# Altium footprint library Mylib.PcbLib: 294 footprints (part 8 of 19)
Each footprint in its own frame and in the unit in brackets; x right, y up, seen from the top. Pads: shape width x height; smd on the part's side, far side on the other; paste and mask are expansions set on the pad; w line width, h text height; cw(c..) or ccw(c..) is an arc to the next point about the centre after c.
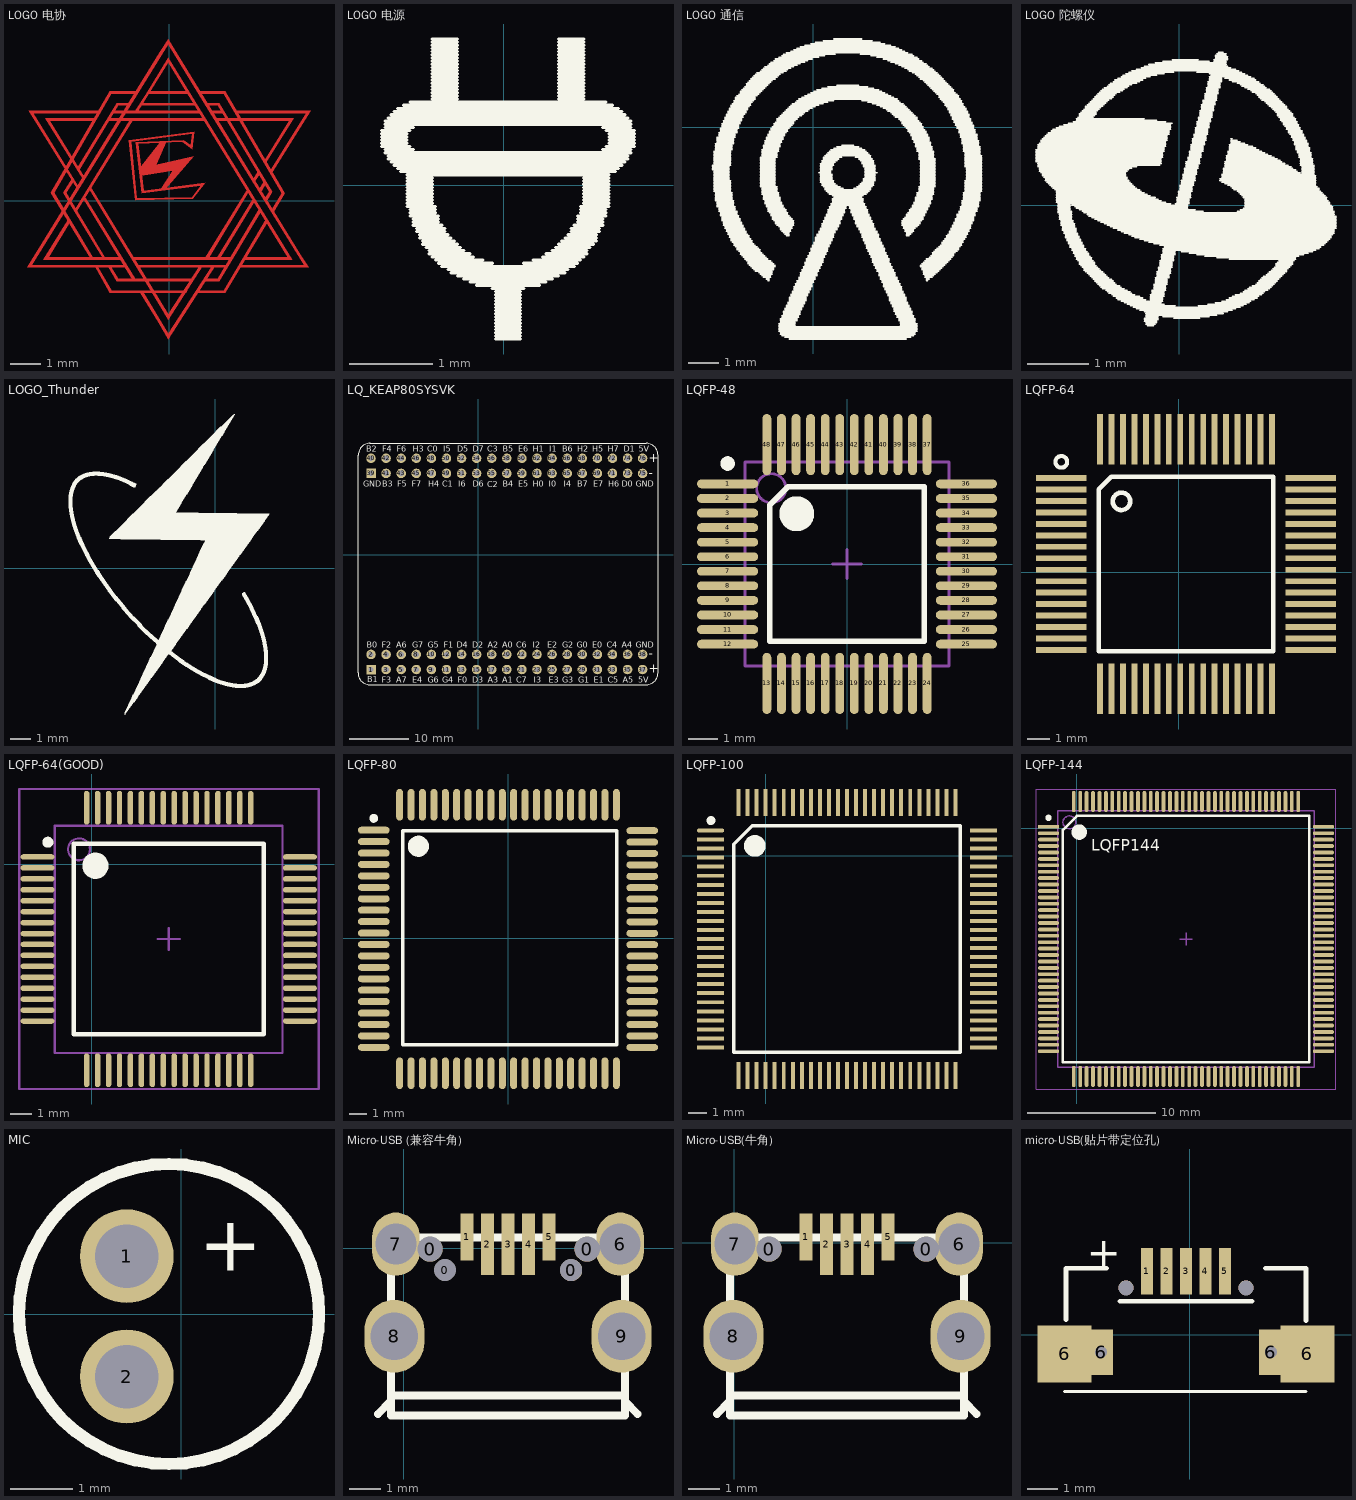
[diagram p7: the footprints below, top view; thin cyan lines are the x and y axes]

## LOGO 电协 [mm]
Top Layer:
  region: -0.307,1.911 -0.961,1.079 -0.917,0.832 0.124,0.984 -0.282,0.374 -0.13,0.374 0.81,1.467 -0.422,1.187 -0.092,1.949
  region: -0.028,5.327 -0.307,4.896 -4.676,-2.191 -4.473,-2.191 -1.45,-2.192 -1.4,-2.115 -1.568,-1.834 -1.654,-1.861 -3.965,-1.861 -3.279,-0.743 -3.33,-0.642 -4.143,-1.937 -1.603,-1.937 -1.488,-2.115 -4.524,-2.115 -0.028,5.15 1.344,2.914 4.442,-2.115 2.41,-2.115 2.36,-2.191 4.595,-2.191 4.341,-1.785
  region: -1.12,2.965 -0.765,3.499 -0.028,4.718 4.061,-1.937 2.512,-1.937 2.563,-1.861 3.909,-1.861 -0.028,4.565 -1.019,2.965
  region: 1.242,3.219 1.648,3.219 3.401,0.298 3.223,-0.007 3.172,0.095 3.299,0.298 1.598,3.143 1.293,3.143
  region: -1.171,-1.861 0.607,-1.861 2.029,-1.861 2.004,-1.937 -1.171,-1.937
  region: -1.019,-2.115 0.759,-2.115 1.928,-2.115 1.902,-2.191 -1.019,-2.191
  region: -1.679,-2.572 -0.612,-2.572 0.81,-2.572 0.785,-2.648 -1.73,-2.648 -2.009,-2.166 -1.908,-2.191
  region: 1.013,3.6 1.852,3.6 3.807,0.247 3.426,-0.388 3.376,-0.286 3.706,0.247 1.801,3.524 1.013,3.524
  region: -1.095,3.6 -1.957,3.6 -3.889,0.273 -2.58,-1.909 -2.517,-1.861 -3.787,0.273 -1.908,3.524 -1.095,3.524
  region: -2.314,2.965 -4.625,2.965 -3.025,0.4 -2.974,0.451 -4.473,2.889 -2.365,2.889
  region: -2.428,2.711 -4.079,2.711 -2.847,0.73 -2.771,0.755 -3.927,2.635 -2.517,2.635
  region: -1.298,2.66 -3.089,-0.273 -3.038,-0.349 -1.196,2.66
  region: 2.588,0.4 1.191,-1.873 1.217,-1.912 1.318,-1.861 2.639,0.324
  region: 2.791,0.095 1.572,-1.886 1.674,-1.912 2.842,0.019
  region: 2.966,-0.266 1.598,-2.572 1.217,-2.572 1.191,-2.648 1.648,-2.648 3.045,-0.311
  region: 3.198,-0.591 1.801,-2.953 0.963,-2.953 0.912,-3.029 1.852,-3.029 3.249,-0.692
  region: -3.178,0.654 -3.193,0.746 -3.482,0.273 -2.173,-1.909 -2.111,-1.861 -3.381,0.273 -3.119,0.671
  region: -1.895,-2.953 -0.828,-2.953 0.594,-2.953 0.569,-3.029 -1.946,-3.029 -2.454,-2.14 -2.352,-2.166
  region: -0.942,-3.029 -0.333,-4.02 -0.021,-4.549 1.521,-2.14 1.42,-2.14 -0.021,-4.375 -0.866,-2.978 -0.942,-3.004
  region: -2.613,0.364 -0.333,-3.385 -0.021,-3.914 1.115,-2.14 1.013,-2.14 -0.021,-3.74 -0.866,-2.343 -2.593,0.476
  region: -2.816,0.06 -1.192,-2.61 -1.108,-2.61 -1.117,-2.57 -2.797,0.171
  region: 0.836,2.279 0.759,1.695 0.429,1.949 0.48,2 0.709,1.822 0.759,2.203 -1.247,1.949 -1.057,0.082 0.759,0.12 1.039,0.501 -0.892,0.247 -1.095,1.924 0.48,2 0.455,1.975 0.429,1.949 -1.019,1.873 -0.841,0.324 1.064,0.578 1.191,0.603 0.785,0.07 -1.12,0.019 -1.323,2
  region: -1.781,2.965 0.988,2.965 0.988,2.94 1.013,2.889 -1.831,2.889
  region: -2.009,2.635 -1.958,2.711 1.115,2.711 1.166,2.635
  region: -0.942,3.219 0.836,3.219 0.81,3.219 0.861,3.194 0.861,3.143 -0.993,3.143
  region: -1.323,3.219 -1.73,3.219 -3.013,1.098 -2.949,1.035 -1.679,3.143 -1.374,3.143
  region: 1.75,2.965 1.394,2.965 1.344,2.914 1.445,2.914 1.471,2.889 1.75,2.889
  region: 1.928,2.711 1.572,2.711 1.521,2.66 1.598,2.635 1.623,2.635 1.648,2.635 1.928,2.635
  region: -0.663,3.6 0.607,3.6 0.632,3.575 0.658,3.549 0.683,3.524 -0.714,3.524
  region: 2.207,2.965 4.646,2.965 4.671,2.965 3.401,0.933 3.337,0.997 4.519,2.889 2.233,2.889
  region: 1.648,2.711 4.087,2.711 4.112,2.711 3.172,1.213 3.147,1.34 3.96,2.635 1.674,2.635
  region: 2.766,0.705 2.918,0.959 2.969,0.908 2.969,0.857 2.842,0.654 2.791,0.654
  region: 2.969,0.374 3.122,0.628 3.172,0.578 3.172,0.527 3.045,0.324 2.995,0.324
  text "协" at 0.201,-1.683 h0.76
  text "电" at -0.739,-1.683 h0.76
  text "大" at 1.115,-0.794 h0.76
  text "集" at -1.552,-0.794 h0.76
Top Solder:
  drawing of 33 lines, arcs and shapes, not listed
  text "集" at -1.552,-0.794 h0.76
  text "大" at 1.115,-0.794 h0.76
  text "电" at -0.739,-1.683 h0.76
  text "协" at 0.201,-1.683 h0.76

## LOGO 电源 [mm]
Top Overlay:
  drawing of 152 lines, arcs and shapes, not listed

## LOGO 通信 [mm]
Top Overlay:
  drawing of 720 lines, arcs and shapes, not listed

## LOGO 陀螺仪 [mm]
Top Overlay:
  drawing of 476 lines, arcs and shapes, not listed

## LOGO_Thunder [mm]
Top Overlay:
  drawing of 2284 lines, arcs and shapes, not listed

## LQ_KEAP80SYSVK [mm]
pads (76):
  rect 1.6x1.6 hole 0.9: 1(-18.016,-19.342) 39(-18.016,13.678)
  round 1.6 hole 0.9: 2(-18.016,-16.802) 3(-15.476,-19.342) 4(-15.476,-16.802) 5(-12.936,-19.342) 6(-12.936,-16.802) 7(-10.396,-19.342) 8(-10.396,-16.802) 9(-7.856,-19.342) 10(-7.856,-16.802) 11(-5.316,-19.342) 12(-5.316,-16.802) 13(-2.776,-19.342) 14(-2.776,-16.802) 15(-0.236,-19.342) 16(-0.236,-16.802) 17(2.304,-19.342) 18(2.304,-16.802) 19(4.844,-19.342) 20(4.844,-16.802) 21(7.384,-19.342) 22(7.384,-16.802) 23(9.924,-19.342) 24(9.924,-16.802) 25(12.464,-19.342) 26(12.464,-16.802) 27(15.004,-19.342) 28(15.004,-16.802) 29(17.544,-19.342) 30(17.544,-16.802) 31(20.084,-19.342) 32(20.084,-16.802) 33(22.624,-19.342) 34(22.624,-16.802) 35(25.164,-19.342) 36(25.164,-16.802) 37(27.704,-19.342) 38(27.704,-16.802) 40(-18.016,16.218) 41(-15.476,13.678) 42(-15.476,16.218) 43(-12.936,13.678) 44(-12.936,16.218) 45(-10.396,13.678) 46(-10.396,16.218) 47(-7.856,13.678) 48(-7.856,16.218) 49(-5.316,13.678) 50(-5.316,16.218) 51(-2.776,13.678) 52(-2.776,16.218) 53(-0.236,13.678) 54(-0.236,16.218) 55(2.304,13.678) 56(2.304,16.218) 57(4.844,13.678) 58(4.844,16.218) 59(7.384,13.678) 60(7.384,16.218) 61(9.924,13.678) 62(9.924,16.218) 63(12.464,13.678) 64(12.464,16.218) 65(15.004,13.678) 66(15.004,16.218) 67(17.544,13.678) 68(17.544,16.218) 69(20.084,13.678) 70(20.084,16.218) 71(22.624,13.678) 72(22.624,16.218) 73(25.164,13.678) 74(25.164,16.218) 75(27.704,13.678) 76(27.704,16.218)
Top Overlay:
  lines w0.2: -20.208,16.739 -20.208,-19.905 ccw(c-18.208,-19.905) -18.208,-21.905 28.292,-21.905 ccw(c28.292,-19.905) 30.292,-19.905 30.292,16.739 ccw(c28.292,16.739) 28.292,18.739 -18.208,18.739 ; -20.158,16.749 cw(c-18.158,16.749) -18.158,18.749
  text "-" at 28.752,13.039 h1.5
  text "+" at 28.742,-19.901 h1.5
  text "-" at 28.752,-17.401 h1.5
  text "+" at 28.762,15.579 h1.5
  text "C3" at 1.522,17.289 h1
  text "H2" at 16.702,17.289 h1
  text "5V" at 26.992,-21.561 h1
  text "A5" at 24.322,-21.561 h1
  text "C5" at 21.822,-21.561 h1
  text "E1" at 19.482,-21.551 h1
  text "G1" at 16.902,-21.561 h1
  text "G3" at 14.132,-21.561 h1
  text "E3" at 11.882,-21.551 h1
  text "I3" at 9.352,-21.561 h1
  text "C7" at 6.472,-21.561 h1
  text "A1" at 4.082,-21.561 h1
  text "A3" at 1.602,-21.561 h1
  text "D3" at -0.938,-21.561 h1
  text "F0" at -3.428,-21.561 h1
  text "G4" at -6.068,-21.561 h1
  text "G6" at -8.488,-21.561 h1
  text "E4" at -11.048,-21.561 h1
  text "A7" at -13.768,-21.561 h1
  text "F3" at -16.208,-21.561 h1
  text "GND" at 26.532,-15.641 h1
  text "A4" at 24.212,-15.641 h1
  text "C4" at 21.652,-15.641 h1
  text "E0" at 19.192,-15.641 h1
  text "G0" at 16.642,-15.641 h1
  text "G2" at 14.132,-15.641 h1
  text "E2" at 11.642,-15.641 h1
  text "I2" at 9.212,-15.641 h1
  text "C6" at 6.472,-15.641 h1
  text "A0" at 4.082,-15.641 h1
  text "A2" at 1.602,-15.641 h1
  text "D2" at -0.938,-15.641 h1
  text "D4" at -3.548,-15.641 h1
  text "F1" at -5.798,-15.641 h1
  text "G5" at -8.488,-15.641 h1
  text "G7" at -11.048,-15.641 h1
  text "A6" at -13.768,-15.641 h1
  text "F2" at -16.208,-15.641 h1
  text "B0" at -18.758,-15.641 h1
  text "GND" at 26.512,11.399 h1
  text "D0" at 24.192,11.399 h1
  text "H6" at 21.952,11.399 h1
  text "E7" at 19.392,11.389 h1
  text "B7" at 16.722,11.399 h1
  text "I4" at 14.442,11.389 h1
  text "I0" at 11.872,11.389 h1
  text "H0" at 9.222,11.399 h1
  text "E5" at 6.772,11.389 h1
  text "B4" at 4.162,11.399 h1
  text "C2" at 1.552,11.379 h1
  text "D6" at -0.858,11.399 h1
  text "I6" at -3.308,11.429 h1
  text "C1" at -5.988,11.399 h1
  text "H4" at -8.408,11.399 h1
  text "F7" at -11.138,11.389 h1
  text "F5" at -13.568,11.389 h1
  text "B3" at -16.128,11.399 h1
  text "GND" at -19.328,11.429 h1
  text "5V" at 27.052,17.289 h1
  text "D1" at 24.532,17.289 h1
  text "H7" at 21.872,17.289 h1
  text "H5" at 19.252,17.289 h1
  text "B6" at 14.192,17.289 h1
  text "I1" at 11.962,17.289 h1
  text "H1" at 9.232,17.289 h1
  text "E6" at 6.772,17.289 h1
  text "B5" at 4.142,17.289 h1
  text "D7" at -0.878,17.289 h1
  text "D5" at -3.488,17.289 h1
  text "I5" at -5.878,17.319 h1
  text "C0" at -8.568,17.289 h1
  text "H3" at -10.988,17.289 h1
  text "F6" at -13.708,17.289 h1
  text "F4" at -16.148,17.289 h1
  text "B2" at -18.788,17.289 h1
  text "B1" at -18.618,-21.521 h1

## LQFP-48 [mm]
pads (48):
  oval 2.1x0.3 smd: 1(-4.1,2.75) 2(-4.1,2.25) 3(-4.1,1.75) 4(-4.1,1.25) 5(-4.1,0.75) 6(-4.1,0.25) 7(-4.1,-0.25) 8(-4.1,-0.75) 9(-4.1,-1.25) 10(-4.1,-1.75) 11(-4.1,-2.25) 12(-4.1,-2.75) 25(4.1,-2.75) 26(4.1,-2.25) 27(4.1,-1.75) 28(4.1,-1.25) 29(4.1,-0.75) 30(4.1,-0.25) 31(4.1,0.25) 32(4.1,0.75) 33(4.1,1.25) 34(4.1,1.75) 35(4.1,2.25) 36(4.1,2.75)
  oval 0.3x2.1 smd: 13(-2.75,-4.1) 14(-2.25,-4.1) 15(-1.75,-4.1) 16(-1.25,-4.1) 17(-0.75,-4.1) 18(-0.25,-4.1) 19(0.25,-4.1) 20(0.75,-4.1) 21(1.25,-4.1) 22(1.75,-4.1) 23(2.25,-4.1) 24(2.75,-4.1) 37(2.75,4.1) 38(2.25,4.1) 39(1.75,4.1) 40(1.25,4.1) 41(0.75,4.1) 42(0.25,4.1) 43(-0.25,4.1) 44(-0.75,4.1) 45(-1.25,4.1) 46(-1.75,4.1) 47(-2.25,4.1) 48(-2.75,4.1)
Top Overlay:
  circle w0.6: c-1.725,1.725 r0.3
  circle w0.25: c-4.1,3.45 r0.125
  lines w0.2: -2.65,-2.65 -2.65,2.025 -2.025,2.65 2.65,2.65 2.65,-2.65 -2.65,-2.65
Mechanical 13:
  circle w0.1: c-2.6,2.6 r0.5
  lines w0.1: -3.5,-3.5 3.5,-3.5 3.5,3.5 -3.5,3.5 -3.5,-3.5
Mechanical 15:
  lines w0.1: -0.5,0 0.5,0 ; 0,-0.5 0,0.5
3D body: height 1.5, standoff 0, extent -4.5,-4.5 4.5,4.5

## LQFP-64 [mil]
pads (64):
  rect 86.61x10 smd: 1(-202,162) 2(-202,142.31) 3(-202,122.63) 4(-202,102.94) 5(-202,83.26) 6(-202,63.58) 7(-202,43.89) 8(-202,24.21) 9(-202,4.52) 10(-202,-15.17) 11(-202,-34.85) 12(-202,-54.54) 13(-202,-74.22) 14(-202,-93.91) 15(-202,-113.59) 16(-202,-133.27) 33(227.13,-133.27) 34(227.13,-113.59) 35(227.13,-93.9) 36(227.13,-74.22) 37(227.13,-54.54) 38(227.13,-34.85) 39(227.13,-15.17) 40(227.13,4.52) 41(227.13,24.21) 42(227.13,43.89) 43(227.13,63.58) 44(227.13,83.26) 45(227.13,102.95) 46(227.13,122.63) 47(227.13,142.31) 48(227.13,162)
  rect 10x86.61 smd: 17(-135.07,-200.2) 18(-115.39,-200.2) 19(-95.7,-200.21) 20(-76.02,-200.2) 21(-56.33,-200.2) 22(-36.65,-200.2) 23(-16.96,-200.21) 24(2.72,-200.2) 25(22.41,-200.2) 26(42.09,-200.21) 27(61.78,-200.2) 28(81.46,-200.2) 29(101.15,-200.21) 30(120.83,-200.2) 31(140.52,-200.2) 32(160.21,-200.2) 49(160.2,228.93) 50(140.52,228.93) 51(120.83,228.93) 52(101.15,228.93) 53(81.46,228.93) 54(61.78,228.93) 55(42.09,228.93) 56(22.41,228.93) 57(2.72,228.93) 58(-16.96,228.93) 59(-36.65,228.93) 60(-56.33,228.93) 61(-76.02,228.93) 62(-95.7,228.93) 63(-115.39,228.93) 64(-135.07,228.93)
Top Overlay:
  circle w7: c-201.77,189.96 r10
  circle w7.87: c-98.43,122.05 r15
  lines w7.87: -137.63,-135.83 -137.63,142.88 -115.95,164.56 162.76,164.56 162.76,-135.83 -137.63,-135.83
3D body: height 63.78, standoff -0.28, extent -226.24,-225.4 251.84,252.68

## LQFP-64(GOOD) [mm]
pads (64):
  oval 1.55x0.25 smd: 1(-2.486,0.325) 2(-2.486,-0.175) 3(-2.486,-0.676) 4(-2.486,-1.175) 5(-2.486,-1.675) 6(-2.486,-2.175) 7(-2.486,-2.675) 8(-2.486,-3.176) 9(-2.486,-3.675) 10(-2.486,-4.175) 11(-2.486,-4.675) 12(-2.486,-5.175) 13(-2.486,-5.676) 14(-2.486,-6.175) 15(-2.486,-6.675) 16(-2.486,-7.175) 33(9.514,-7.175) 34(9.514,-6.675) 35(9.514,-6.175) 36(9.514,-5.676) 37(9.514,-5.175) 38(9.514,-4.675) 39(9.514,-4.175) 40(9.514,-3.675) 41(9.514,-3.176) 42(9.514,-2.675) 43(9.514,-2.175) 44(9.514,-1.675) 45(9.514,-1.175) 46(9.514,-0.676) 47(9.514,-0.175) 48(9.514,0.325)
  oval 0.25x1.55 smd: 17(-0.236,-9.426) 18(0.263,-9.426) 19(0.764,-9.426) 20(1.264,-9.426) 21(1.763,-9.426) 22(2.264,-9.426) 23(2.763,-9.426) 24(3.264,-9.426) 25(3.764,-9.426) 26(4.263,-9.426) 27(4.764,-9.426) 28(5.263,-9.426) 29(5.764,-9.426) 30(6.264,-9.426) 31(6.763,-9.426) 32(7.264,-9.426) 49(7.264,2.575) 50(6.763,2.575) 51(6.264,2.575) 52(5.764,2.575) 53(5.263,2.575) 54(4.764,2.575) 55(4.263,2.575) 56(3.764,2.575) 57(3.264,2.575) 58(2.763,2.575) 59(2.264,2.575) 60(1.763,2.575) 61(1.264,2.575) 62(0.764,2.575) 63(0.263,2.575) 64(-0.236,2.575)
Top Overlay:
  circle w0.25: c-2.011,1 r0.125
  circle w0.6: c0.163,-0.075 r0.3
  lines w0.2: -0.837,-7.775 -0.837,0.925 7.863,0.925 7.863,-7.775 -0.837,-7.775
Mechanical 13:
  circle w0.1: c-0.586,0.674 r0.5
  lines w0.1: -1.693,-8.632 -1.693,1.756 8.721,1.756 8.721,-8.632 -1.693,-8.632
Mechanical 15:
  lines w0.1: 3.013,-3.425 4.013,-3.425 ; 3.514,-3.925 3.514,-2.925 ; -3.319,-10.283 -3.319,3.433 10.372,3.433 10.372,-10.283 -3.319,-10.283
3D body: height 1.2, standoff 0, extent -1.693,-8.632 8.721,1.782
3D body: height 0.3, standoff 0, extent 7.137,2.003 7.391,3.146
3D body: height 0.3, standoff 0, extent 6.646,2.003 6.9,3.146
3D body: height 0.3, standoff 0, extent 6.146,2.003 6.4,3.146
3D body: height 0.3, standoff 0, extent 5.646,2.003 5.9,3.146
3D body: height 0.3, standoff 0, extent 5.146,2.003 5.4,3.146
3D body: height 0.3, standoff 0, extent 4.646,2.003 4.9,3.146
3D body: height 0.3, standoff 0, extent 4.146,2.003 4.4,3.146
3D body: height 0.3, standoff 0, extent 3.646,2.003 3.9,3.146
3D body: height 0.3, standoff 0, extent 3.146,2.003 3.4,3.146
3D body: height 0.3, standoff 0, extent 2.646,2.003 2.9,3.146
3D body: height 0.3, standoff 0, extent 2.146,2.003 2.4,3.146
3D body: height 0.3, standoff 0, extent 1.646,2.003 1.9,3.146
3D body: height 0.3, standoff 0, extent 1.146,2.003 1.4,3.146
3D body: height 0.3, standoff 0, extent 0.646,2.003 0.9,3.146
3D body: height 0.3, standoff 0, extent 0.146,2.003 0.4,3.146
3D body: height 0.3, standoff 0, extent -0.354,2.003 -0.1,3.146
3D body: height 0.3, standoff 0, extent -3.04,-7.312 -1.897,-7.058
3D body: height 0.3, standoff 0, extent -3.04,-6.812 -1.897,-6.558
3D body: height 0.3, standoff 0, extent -3.04,-6.312 -1.897,-6.058
3D body: height 0.3, standoff 0, extent -3.04,-5.812 -1.897,-5.558
3D body: height 0.3, standoff 0, extent -3.04,-5.312 -1.897,-5.058
3D body: height 0.3, standoff 0, extent -3.04,-4.812 -1.897,-4.558
3D body: height 0.3, standoff 0, extent -3.04,-4.312 -1.897,-4.058
3D body: height 0.3, standoff 0, extent -3.04,-3.812 -1.897,-3.558
3D body: height 0.3, standoff 0, extent -3.04,-3.312 -1.897,-3.058
3D body: height 0.3, standoff 0, extent -3.04,-2.812 -1.897,-2.558
3D body: height 0.3, standoff 0, extent -3.04,-2.312 -1.897,-2.058
3D body: height 0.3, standoff 0, extent -3.04,-1.812 -1.897,-1.558
3D body: height 0.3, standoff 0, extent -3.04,-1.312 -1.897,-1.058
3D body: height 0.3, standoff 0, extent -3.04,-0.812 -1.897,-0.558
3D body: height 0.3, standoff 0, extent -3.04,-0.312 -1.897,-0.058
3D body: height 0.3, standoff 0, extent -3.04,0.198 -1.897,0.452
3D body: height 0.3, standoff 0, extent 8.942,-7.302 10.085,-7.048
3D body: height 0.3, standoff 0, extent 8.942,-6.812 10.085,-6.558
3D body: height 0.3, standoff 0, extent 8.942,-6.312 10.085,-6.058
3D body: height 0.3, standoff 0, extent 8.942,-5.812 10.085,-5.558
3D body: height 0.3, standoff 0, extent 8.942,-5.312 10.085,-5.058
3D body: height 0.3, standoff 0, extent 8.942,-4.812 10.085,-4.558
3D body: height 0.3, standoff 0, extent 8.942,-4.312 10.085,-4.058
3D body: height 0.3, standoff 0, extent 8.942,-3.812 10.085,-3.558
3D body: height 0.3, standoff 0, extent 8.942,-3.312 10.085,-3.058
3D body: height 0.3, standoff 0, extent 8.942,-2.812 10.085,-2.558
3D body: height 0.3, standoff 0, extent 8.942,-2.312 10.085,-2.058
3D body: height 0.3, standoff 0, extent 8.942,-1.812 10.085,-1.558
3D body: height 0.3, standoff 0, extent 8.942,-1.312 10.085,-1.058
3D body: height 0.3, standoff 0, extent 8.942,-0.812 10.085,-0.558
3D body: height 0.3, standoff 0, extent 8.942,-0.312 10.085,-0.058
3D body: height 0.3, standoff 0, extent 8.942,0.198 10.085,0.452
3D body: height 0.3, standoff 0, extent 7.162,-9.966 7.416,-8.823
3D body: height 0.3, standoff 0, extent 6.662,-9.966 6.916,-8.823
3D body: height 0.3, standoff 0, extent 6.162,-9.966 6.416,-8.823
3D body: height 0.3, standoff 0, extent 5.662,-9.966 5.916,-8.823
3D body: height 0.3, standoff 0, extent 5.162,-9.966 5.416,-8.823
3D body: height 0.3, standoff 0, extent 4.662,-9.966 4.916,-8.823
3D body: height 0.3, standoff 0, extent 4.162,-9.966 4.416,-8.823
3D body: height 0.3, standoff 0, extent 3.662,-9.966 3.916,-8.823
3D body: height 0.3, standoff 0, extent 3.162,-9.966 3.416,-8.823
3D body: height 0.3, standoff 0, extent 2.662,-9.966 2.916,-8.823
3D body: height 0.3, standoff 0, extent 2.162,-9.966 2.416,-8.823
3D body: height 0.3, standoff 0, extent 1.662,-9.966 1.916,-8.823
3D body: height 0.3, standoff 0, extent 1.162,-9.966 1.416,-8.823
3D body: height 0.3, standoff 0, extent 0.662,-9.966 0.916,-8.823
3D body: height 0.3, standoff 0, extent 0.162,-9.966 0.416,-8.823
3D body: height 0.3, standoff 0, extent -0.338,-9.966 -0.084,-8.823
3D body: height 1.21, standoff 0, extent -0.596,0.287 -0.198,0.686

## LQFP-80 [mm]
pads (80):
  oval 1.8x0.4 smd: 1(-7.66,6.149) 2(-7.66,5.497) 3(-7.66,4.846) 4(-7.66,4.195) 5(-7.66,3.543) 6(-7.66,2.892) 7(-7.66,2.24) 8(-7.66,1.589) 9(-7.66,0.937) 10(-7.66,0.286) 11(-7.66,-0.365) 12(-7.66,-1.017) 13(-7.66,-1.668) 14(-7.66,-2.32) 15(-7.66,-2.971) 16(-7.66,-3.623) 17(-7.66,-4.274) 18(-7.66,-4.925) 19(-7.66,-5.577) 20(-7.66,-6.228) 41(7.64,-6.228) 42(7.64,-5.578) 43(7.64,-4.928) 44(7.64,-4.278) 45(7.64,-3.628) 46(7.64,-2.978) 47(7.64,-2.328) 48(7.64,-1.678) 49(7.64,-1.028) 50(7.64,-0.378) 51(7.64,0.272) 52(7.64,0.922) 53(7.64,1.572) 54(7.64,2.222) 55(7.64,2.872) 56(7.64,3.522) 57(7.64,4.172) 58(7.64,4.822) 59(7.64,5.472) 60(7.64,6.122)
  oval 0.4x1.8 smd: 21(-6.185,-7.703) 22(-5.535,-7.703) 23(-4.885,-7.703) 24(-4.235,-7.703) 25(-3.585,-7.703) 26(-2.935,-7.703) 27(-2.285,-7.703) 28(-1.635,-7.703) 29(-0.985,-7.703) 30(-0.335,-7.703) 31(0.315,-7.703) 32(0.965,-7.703) 33(1.615,-7.703) 34(2.265,-7.703) 35(2.915,-7.703) 36(3.565,-7.703) 37(4.215,-7.703) 38(4.865,-7.703) 39(5.515,-7.703) 40(6.165,-7.703) 61(6.165,7.597) 62(5.515,7.597) 63(4.865,7.597) 64(4.215,7.597) 65(3.565,7.597) 66(2.915,7.597) 67(2.265,7.597) 68(1.615,7.597) 69(0.965,7.597) 70(0.315,7.597) 71(-0.335,7.597) 72(-0.985,7.597) 73(-1.635,7.597) 74(-2.285,7.597) 75(-2.935,7.597) 76(-3.585,7.597) 77(-4.235,7.597) 78(-4.885,7.597) 79(-5.535,7.597) 80(-6.185,7.597)
Top Overlay:
  circle w0.25: c-7.66,6.822 r0.125
  circle w0.6: c-5.12,5.233 r0.3
  lines w0.2: -6.009,-6.07 -6.009,6.122 6.183,6.122 6.183,-6.07 -6.009,-6.07
3D body: height 1.75, standoff 0, extent -8.031,-8.084 8.006,7.952

## LQFP-100 [mm]
pads (100):
  oval 1.5x0.22 smd: 1(-3.048,1.397)
  rect 1.5x0.22 smd: 2(-3.048,0.897) 3(-3.048,0.397) 4(-3.048,-0.103) 5(-3.048,-0.603) 6(-3.048,-1.103) 7(-3.048,-1.603) 8(-3.048,-2.103) 9(-3.048,-2.603) 10(-3.048,-3.103) 11(-3.048,-3.603) 12(-3.048,-4.103) 13(-3.048,-4.603) 14(-3.048,-5.103) 15(-3.048,-5.603) 16(-3.048,-6.103) 17(-3.048,-6.603) 18(-3.048,-7.103) 19(-3.048,-7.603) 20(-3.048,-8.103) 21(-3.048,-8.603) 22(-3.048,-9.103) 23(-3.048,-9.603) 24(-3.048,-10.103) 25(-3.048,-10.603) 51(12.05,-10.603) 52(12.05,-10.103) 53(12.05,-9.603) 54(12.05,-9.103) 55(12.05,-8.603) 56(12.05,-8.103) 57(12.05,-7.603) 58(12.05,-7.103) 59(12.05,-6.603) 60(12.05,-6.103) 61(12.05,-5.603) 62(12.05,-5.103) 63(12.05,-4.603) 64(12.05,-4.103) 65(12.05,-3.603) 66(12.05,-3.103) 67(12.05,-2.603) 68(12.05,-2.103) 69(12.05,-1.603) 70(12.05,-1.103) 71(12.05,-0.603) 72(12.05,-0.103) 73(12.05,0.397) 74(12.05,0.897) 75(12.05,1.397)
  rect 0.22x1.5 smd: 26(-1.499,-12.152) 27(-0.999,-12.152) 28(-0.499,-12.152) 29(0.001,-12.152) 30(0.501,-12.152) 31(1.001,-12.152) 32(1.501,-12.152) 33(2.001,-12.152) 34(2.501,-12.152) 35(3.001,-12.152) 36(3.501,-12.152) 37(4.001,-12.152) 38(4.501,-12.152) 39(5.001,-12.152) 40(5.501,-12.152) 41(6.001,-12.152) 42(6.501,-12.152) 43(7.001,-12.152) 44(7.501,-12.152) 45(8.001,-12.152) 46(8.501,-12.152) 47(9.001,-12.152) 48(9.501,-12.152) 49(10.001,-12.152) 50(10.501,-12.152) 76(10.501,2.946) 77(10.001,2.946) 78(9.501,2.946) 79(9.001,2.946) 80(8.501,2.946) 81(8.001,2.946) 82(7.501,2.946) 83(7.001,2.946) 84(6.501,2.946) 85(6.001,2.946) 86(5.501,2.946) 87(5.001,2.946) 88(4.501,2.946) 89(4.001,2.946) 90(3.501,2.946) 91(3.001,2.946) 92(2.501,2.946) 93(2.001,2.946) 94(1.501,2.946) 95(1.001,2.946) 96(0.501,2.946) 97(0.001,2.946) 98(-0.499,2.946) 99(-0.999,2.946) 100(-1.499,2.946)
Top Overlay:
  circle w0.6: c-0.6,0.55 r0.3
  circle w0.25: c-3.025,1.95 r0.125
  lines w0.2: -1.763,-10.867 -1.763,0.637 -0.739,1.661 10.765,1.661 10.765,-10.867 -1.763,-10.867
3D body: height 1.62, standoff -0.01, extent -3.572,-12.675 12.572,3.468

## LQFP-144 [mm]
pads (144):
  rect 1.651x0.3 smd: 1(-2.199,0.11)
  oval 1.651x0.3 smd: 2(-2.199,-0.39) 3(-2.199,-0.89) 4(-2.199,-1.39) 5(-2.199,-1.89) 6(-2.199,-2.39) 7(-2.199,-2.89) 8(-2.199,-3.39) 9(-2.199,-3.89) 10(-2.199,-4.39) 11(-2.199,-4.89) 12(-2.199,-5.39) 13(-2.199,-5.89) 14(-2.199,-6.39) 15(-2.199,-6.89) 16(-2.199,-7.39) 17(-2.199,-7.89) 18(-2.199,-8.39) 19(-2.199,-8.89) 20(-2.199,-9.39) 21(-2.199,-9.89) 22(-2.199,-10.39) 23(-2.199,-10.89) 24(-2.199,-11.39) 25(-2.199,-11.89) 26(-2.199,-12.39) 27(-2.199,-12.89) 28(-2.199,-13.39) 29(-2.199,-13.89) 30(-2.199,-14.39) 31(-2.199,-14.89) 32(-2.199,-15.39) 33(-2.199,-15.89) 34(-2.199,-16.39) 35(-2.199,-16.89) 36(-2.199,-17.39) 73(19.251,-17.39) 74(19.251,-16.89) 75(19.251,-16.39) 76(19.251,-15.89) 77(19.251,-15.39) 78(19.251,-14.89) 79(19.251,-14.39) 80(19.251,-13.89) 81(19.251,-13.39) 82(19.251,-12.89) 83(19.251,-12.39) 84(19.251,-11.89) 85(19.251,-11.39) 86(19.251,-10.89) 87(19.251,-10.39) 88(19.251,-9.89) 89(19.251,-9.39) 90(19.251,-8.89) 91(19.251,-8.39) 92(19.251,-7.89) 93(19.251,-7.39) 94(19.251,-6.89) 95(19.251,-6.39) 96(19.251,-5.89) 97(19.251,-5.39) 98(19.251,-4.89) 99(19.251,-4.39) 100(19.251,-3.89) 101(19.251,-3.39) 102(19.251,-2.89) 103(19.251,-2.39) 104(19.251,-1.89) 105(19.251,-1.39) 106(19.251,-0.89) 107(19.251,-0.39) 108(19.251,0.11)
  oval 0.3x1.651 smd: 37(-0.224,-19.365) 38(0.276,-19.365) 39(0.776,-19.365) 40(1.276,-19.365) 41(1.776,-19.365) 42(2.276,-19.365) 43(2.776,-19.365) 44(3.276,-19.365) 45(3.776,-19.365) 46(4.276,-19.365) 47(4.776,-19.365) 48(5.276,-19.365) 49(5.776,-19.365) 50(6.276,-19.365) 51(6.776,-19.365) 52(7.276,-19.365) 53(7.776,-19.365) 54(8.276,-19.365) 55(8.776,-19.365) 56(9.276,-19.365) 57(9.776,-19.365) 58(10.276,-19.365) 59(10.776,-19.365) 60(11.276,-19.365) 61(11.776,-19.365) 62(12.276,-19.365) 63(12.776,-19.365) 64(13.276,-19.365) 65(13.776,-19.365) 66(14.276,-19.365) 67(14.776,-19.365) 68(15.276,-19.365) 69(15.776,-19.365) 70(16.276,-19.365) 71(16.776,-19.365) 72(17.276,-19.365) 109(17.276,2.085) 110(16.776,2.085) 111(16.276,2.085) 112(15.776,2.085) 113(15.276,2.085) 114(14.776,2.085) 115(14.276,2.085) 116(13.776,2.085) 117(13.276,2.085) 118(12.776,2.085) 119(12.276,2.085) 120(11.776,2.085) 121(11.276,2.085) 122(10.776,2.085) 123(10.276,2.085) 124(9.776,2.085) 125(9.276,2.085) 126(8.776,2.085) 127(8.276,2.085) 128(7.776,2.085) 129(7.276,2.085) 130(6.776,2.085) 131(6.276,2.085) 132(5.776,2.085) 133(5.276,2.085) 134(4.776,2.085) 135(4.276,2.085) 136(3.776,2.085) 137(3.276,2.085) 138(2.776,2.085) 139(2.276,2.085) 140(1.776,2.085) 141(1.276,2.085) 142(0.776,2.085) 143(0.276,2.085) 144(-0.224,2.085)
Top Overlay:
  circle w0.6: c0.2,-0.3 r0.3
  circle w0.25: c-2.199,0.81 r0.125
  lines w0.2: -1.074,-18.24 -1.074,-0.124 0.01,0.96 18.126,0.96 18.126,-18.24 -1.074,-18.24
  text "LQFP144" at 1.125,-2.05 h1.52
Mechanical 13:
  circle w0.1: c-0.574,0.46 r0.5
  lines w0.1: -1.474,-18.64 18.526,-18.64 18.526,1.36 -1.474,1.36 -1.474,-18.64
Mechanical 15:
  lines w0.05: -3.174,-20.34 20.226,-20.34 20.226,3.06 -3.174,3.06 -3.174,-20.34
  lines w0.1: 8.026,-8.64 9.026,-8.64 ; 8.526,-9.14 8.526,-8.14
3D body "TSQFP50P2200X2200X160-144N.step": height 1.6, standoff 0, extent -2.474,-19.64 19.526,2.36

## MIC [mm]
pads (2):
  round 1.5 hole 1.016: 1(-0.875,0.925) 2(-0.875,-1)
Top Overlay:
  circle w0.2: c-0.2,0 r2.4
  text "+" at 0.275,0.4 h1.52
3D body "User Library-6022microphone.STEP": height 2.21, standoff -2.85, extent -3.1,-2.975 2.9,3.025

## Micro-USB (兼容牛角) [mm]
pads (13):
  round 0.8 hole 0.8: 0(0.825,-0.025) 0(5.8,-0.025)
  oval 0.47x0.7 hole 0.7: 0(1.294,-0.69)
  round 0.7 hole 0.7: 0(5.294,-0.69)
  rect 0.4x1.5 smd: 1(1.994,0.359) 5(4.594,0.359)
  rect 0.4x1.95 smd: 2(2.644,0.135) 3(3.294,0.135) 4(3.944,0.135)
  oval 1.5x2 hole 1.3: 6(6.844,0.135) 7(-0.256,0.135)
  oval 1.9x2.3 hole 1.5: 8(-0.306,-2.786) 9(6.894,-2.786)
Top Overlay:
  lines w0.254: -0.83,-5.253 -0.406,-4.83 -0.406,-4.665 ; -0.414,-5.295 -0.406,-5.295 ; 7.4,-5.253 6.994,-4.847 6.994,-4.665 ; -0.406,-5.295 6.994,-5.295 6.994,-4.665 ; -0.406,-5.295 -0.406,-4.665 ; -0.406,-4.665 6.994,-4.665 ; -0.406,-4.665 -0.406,0.335 6.994,0.335 6.994,-4.665
3D body "User Library-MicroUSB-B_Molex_105017-0001.STEP": height 0.23, standoff -3.08, extent -0.776,-5.338 7.424,0.092

## Micro-USB(牛角) [mm]
pads (11):
  round 0.8 hole 0.8: 0(1.1,-0.2) 0(6.075,-0.2)
  rect 0.4x1.5 smd: 1(2.269,0.184) 5(4.869,0.184)
  rect 0.4x1.95 smd: 2(2.919,-0.04) 3(3.569,-0.04) 4(4.219,-0.04)
  oval 1.5x2 hole 1.3: 6(7.119,-0.04) 7(0.019,-0.04)
  oval 1.9x2.3 hole 1.5: 8(-0.031,-2.961) 9(7.169,-2.961)
Top Overlay:
  lines w0.254: -0.555,-5.428 -0.131,-5.005 -0.131,-4.84 ; -0.139,-5.47 -0.131,-5.47 ; 7.675,-5.428 7.269,-5.022 7.269,-4.84 ; -0.131,-5.47 7.269,-5.47 7.269,-4.84 ; -0.131,-5.47 -0.131,-4.84 ; -0.131,-4.84 7.269,-4.84 ; -0.131,-4.84 -0.131,0.16 7.269,0.16 7.269,-4.84
3D body "User Library-MicroUSB-B_Molex_105017-0001.STEP": height 0.23, standoff -3.08, extent -0.501,-5.513 7.699,-0.083

## micro-USB(贴片带定位孔) [mm]
pads (11):
  rect 0.4x1.55 smd: 1(-1.423,2.116) 2(-0.773,2.116) 3(-0.123,2.116) 4(0.527,2.116) 5(1.177,2.116)
  rect 1.8x1.9 smd: 6(-4.173,-0.634) 6(3.927,-0.634)
  rect 0.8x1.5 hole 0.4: 6(-2.948,-0.584) 6(2.702,-0.584)
  round 0.5 hole 0.5 unplated: ""(-2.123,1.566) ""(1.877,1.566)
Top Overlay:
  lines w0.1: -4.173,-1.884 3.877,-1.884
  lines w0.152: -4.123,0.5 -4.123,2.216 -2.773,2.216 ; -2.323,1.116 2.077,1.116 ; 2.527,2.216 3.877,2.216 3.877,0.466
  text "+" at -3.423,2.266 h1
Keep-Out Layer:
  lines w0.127: -3.177,-1.127 -3.177,-0.009 -2.719,-0.009 -2.719,-1.127 -3.177,-1.127 ; 2.473,-1.127 2.931,-1.127 2.931,-0.009 2.473,-0.009 2.473,-1.127
Mechanical 1:
  lines w0.127: -3.177,-1.127 -2.719,-1.127 -2.719,-0.009 -3.177,-0.009 -3.177,-1.127 ; 2.473,-1.127 2.931,-1.127 2.931,-0.009 2.473,-0.009 2.473,-1.127
3D body "MICRO-USB.stp": height 2.47, standoff -0.92, extent -4.075,-2.7 3.875,3.076